# Altium footprint library iMag.PcbLib: 52 footprints (part 3 of 4)
Each footprint in its own frame and in the unit in brackets; x right, y up, seen from the top. Pads: shape width x height; smd on the part's side, far side on the other; paste and mask are expansions set on the pad; w line width, h text height; cw(c..) or ccw(c..) is an arc to the next point about the centre after c.
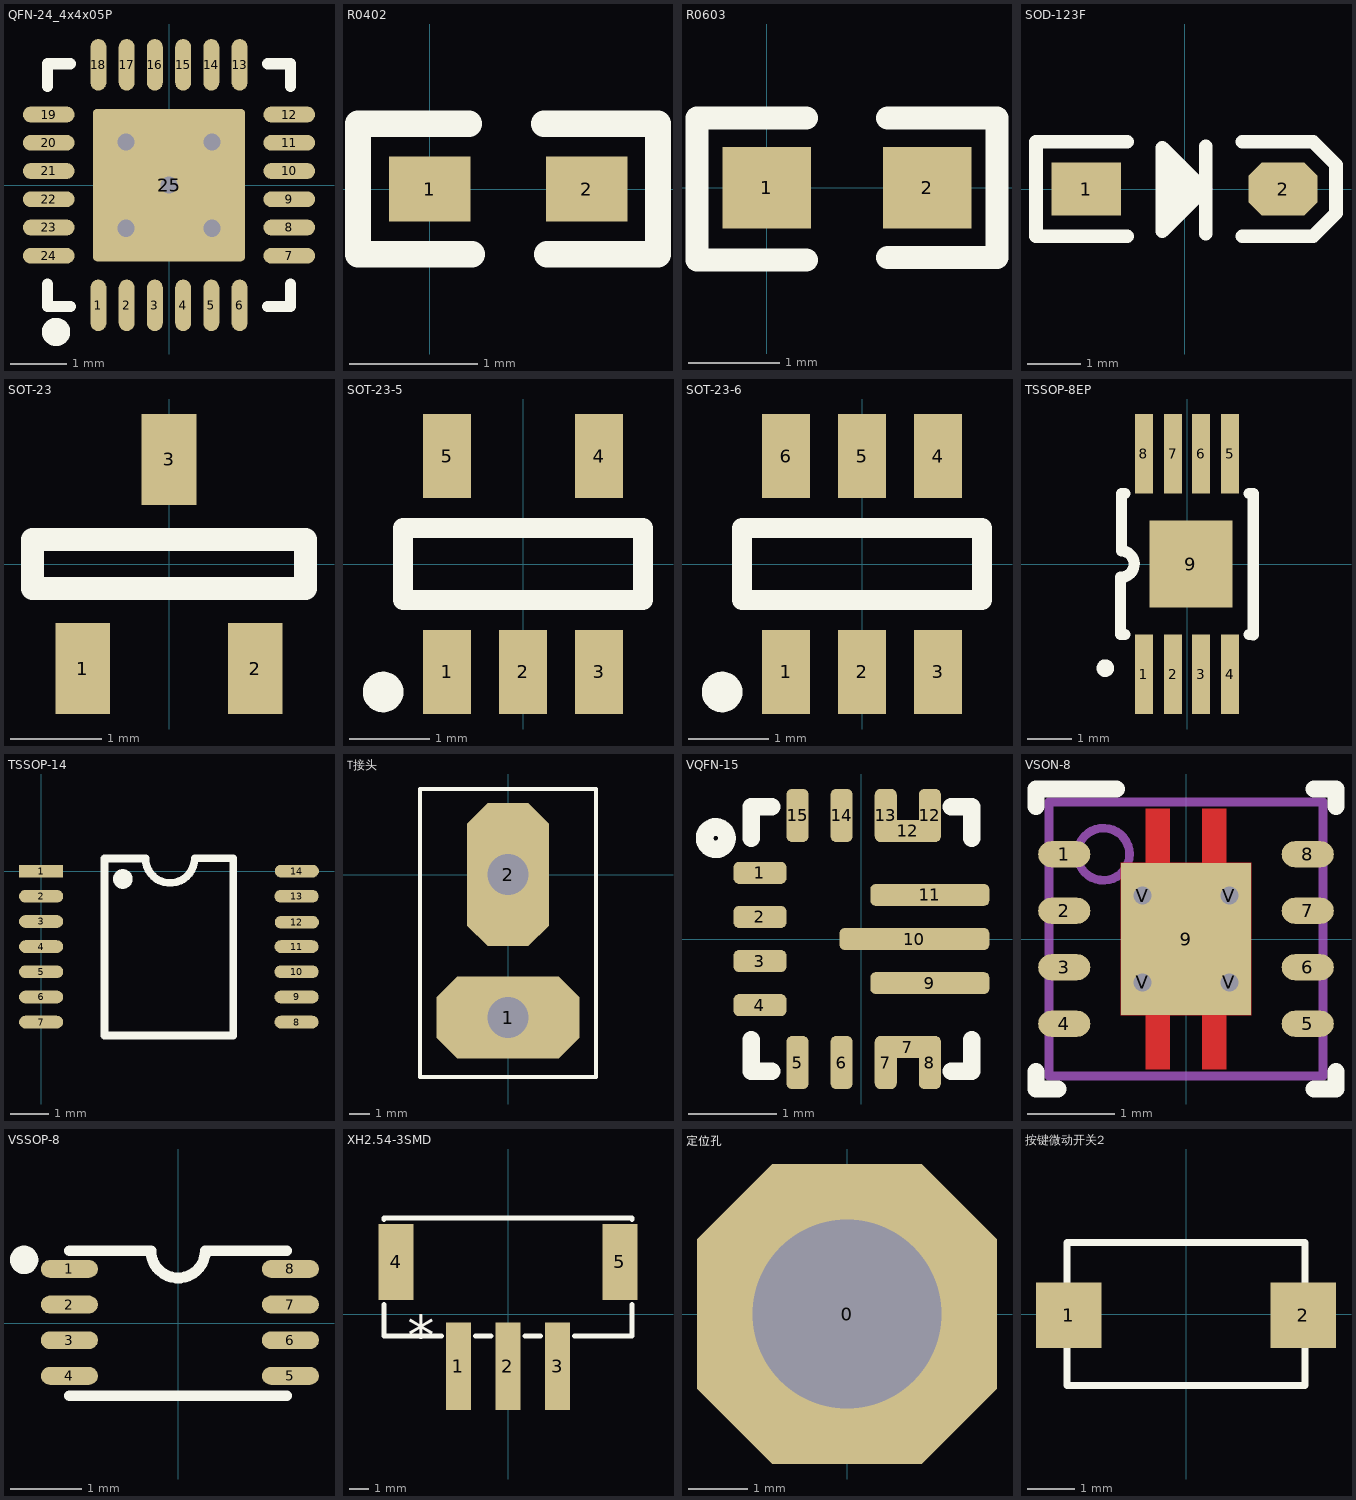
[diagram p2: the footprints below, top view; thin cyan lines are the x and y axes]

## QFN-24_4x4x05P [mm]
height 1
pads (25):
  oval 0.28x0.914 smd mask+0.051: 1(-1.25,-2.13) 2(-0.75,-2.13) 3(-0.25,-2.13) 4(0.25,-2.13) 5(0.75,-2.13) 6(1.25,-2.13) 13(1.25,2.13) 14(0.75,2.13) 15(0.25,2.13) 16(-0.25,2.13) 17(-0.75,2.13) 18(-1.25,2.13)
  oval 0.914x0.28 smd mask+0.051: 7(2.13,-1.25) 8(2.13,-0.75) 9(2.13,-0.25) 10(2.13,0.25) 11(2.13,0.75) 12(2.13,1.25) 19(-2.13,1.25) 20(-2.13,0.75) 21(-2.13,0.25) 22(-2.13,-0.25) 23(-2.13,-0.75) 24(-2.13,-1.25)
  rrect6% 2.7x2.7 smd mask+0.051: 25(0,0)
via -0.762,0.762 diameter 0.635 hole 0.305
via -0.762,-0.762 diameter 0.635 hole 0.305
via 0.762,-0.762 diameter 0.635 hole 0.305
via 0.762,0.762 diameter 0.635 hole 0.305
via 0,0 diameter 0.635 hole 0.305
Top Overlay:
  circle w0.25: c-2,-2.6 r0.125
  lines w0.2: -2.15,-1.75 -2.15,-2.15 -1.75,-2.15 ; -2.15,1.75 -2.15,2.15 -1.75,2.15 ; 1.75,-2.15 2.15,-2.15 2.15,-1.75 ; 1.75,2.15 2.15,2.15 2.15,1.75
3D body: height 0.9, standoff 0.01, extent -2,-2 2,2

## R0402 [mil] "1/16W"
pads (2):
  rect 25x20 smd: 1(0,0) 2(48.2,0)
Top Overlay:
  lines w8: 12,20 -22,20 -22,-20 13,-20 ; 35,20 70,20 70,-20 36,-20
3D body "R0402.STEP": height 13.78, standoff 0, extent 4.71,-9.79 44.09,9.9

## R0603 [mil] "1/10W"
pads (2):
  rect 38x35 smd: 1(0,0) 2(69,0)
Top Overlay:
  lines w10: 17,-31 -30,-31 -30,30 17,30 ; 52,-30 99,-30 99,30 52,30
3D body "R0603.STEP": height 17.72, standoff 0, extent 3.51,-15.74 66.5,15.75

## SOD-123F [mm] "2.7x1.6X1.1mm（长宽高，不包括引脚）"
pads (2):
  rect 1.3x1 smd: 1(-1.85,0)
  oct 1.3x1 smd: 2(1.85,0)
Top Overlay:
  lines w0.254: -1.079,-0.889 -2.794,-0.889 -2.794,0.889 -1.079,0.889 ; -0.254,0.559 -0.229,-0.432 0.254,0 0,0.254 0,0 0,-0.254 ; 0.356,-0.02 -0.417,-0.792 -0.417,0.775 0.396,-0.038 ; 0.396,-0.841 0.396,0.805 ; 1.079,-0.889 2.413,-0.889 2.845,-0.457 2.845,0.457 2.413,0.889 1.079,0.889
Mechanical 15:
  circle w0.05: c0,0 r0.35
  lines w0.05: -0.5,0 0.5,0 ; 0,-0.5 0,0.5
3D body "SOD-123F.STEP": height 1.15, standoff 0.04, extent -1.9,-0.8 1.9,0.8

## SOT-23 [mm] "SOT-23-3"
height 1.1
pads (3):
  rect 0.6x1 smd: 1(-0.95,-1.15) 2(0.95,-1.15) 3(0,1.15)
Top Overlay:
  lines w0.254: -1.5,-0.27 1.5,-0.27 1.5,0.27 -1.5,0.27 -1.5,-0.27
3D body "SOT-23-3.STEP": height 0.99, standoff 0.01, extent -1.46,-1.275 1.46,1.273

## SOT-23-5 [mm] "SOT-23-5"
height 1.2
pads (5):
  rect 0.6x1.05 smd: 1(-0.95,-1.35) 2(0,-1.35) 3(0.95,-1.35) 4(0.95,1.35) 5(-0.95,1.35)
Top Overlay:
  circle w0.254: c-1.75,-1.6 r0.127
  lines w0.254: -1.5,-0.45 -1.5,0.45 1.5,0.45 1.5,-0.45 -1.5,-0.45
3D body "SOT-23-5.STEP": height 1.3, standoff 0, extent -1.5,-1.5 1.5,1.5

## SOT-23-6 [mm] "SOT-23-6"
height 1.2
pads (6):
  rect 0.6x1.05 smd: 1(-0.95,-1.35) 2(0,-1.35) 3(0.95,-1.35) 4(0.95,1.35) 5(0,1.35) 6(-0.95,1.35)
Top Overlay:
  circle w0.254: c-1.75,-1.6 r0.127
  lines w0.254: -1.5,-0.45 -1.5,0.45 1.5,0.45 1.5,-0.45 -1.5,-0.45
3D body "SOT-23-6.STEP": height 1.3, standoff 0, extent -1.5,-1.5 1.5,1.5

## TSSOP-8EP [mil] "TSSOP-8_L3.0-W3.0-P0.65-LS4.9-BL-EP"
pads (9):
  rect 16x71 smd: 1(-38.5,-98.42) 2(-12.5,-98.42) 3(12.5,-98.42) 4(38.5,-98.42) 5(38.5,98.42) 6(12.5,98.42) 7(-12.5,98.42) 8(-38.5,98.42)
  rect 74.02x77.96 smd: 9(3.5,-0.03)
Top Overlay:
  circle w10: c-73,-93 r2.83
  lines w10: -55.6,-63 -59.5,-63 -59.5,-11.81 ccw(c-59,0.01) -58.5,11.81 -58.5,62.96 -55.6,62.96 ; 55.6,-63 59.1,-63 ; 55.6,62.96 59.1,62.96 ; 59.1,-63.1 59.1,62.8
3D body "PW8-M.step": height 47.09, standoff 0, extent -60.98,-129.99 60.99,130.01

## TSSOP-14 [mm] "4.96x4.40x1.00 e=0.65（蒜米工坊）"
pads (14):
  rect 1.143x0.33 smd: 1(0,0)
  oval 1.143x0.33 smd: 2(0,-0.65) 3(0,-1.3) 4(0,-1.95) 5(0,-2.6) 6(0,-3.25) 7(0,-3.9) 8(6.6,-3.9) 9(6.6,-3.25) 10(6.6,-2.6) 11(6.6,-1.95) 12(6.608,-1.321) 13(6.6,-0.65) 14(6.608,0)
Top Overlay:
  circle w0.254: c2.112,-0.203 r0.127
  lines w0.2: 2.687,0.325 1.635,0.325 1.635,-4.249 4.965,-4.249 4.965,0.325 ; 2.696,0.33 ccw(c3.331,0.33) 3.966,0.33 4.96,0.33
3D body "TSSOP14.STEP": height 1.03, standoff -0.02, extent 0.028,-4.43 6.432,0.57

## T接头 [mm]
pads (2):
  oct 7x4 hole 2 square: 1(0,-7)
  oct 4x7 hole 2 square: 2(0,0)
Top Overlay:
  lines w0.2: -4.318,-9.906 4.318,-9.906 4.318,-8.217 4.318,-2.233 4.318,4.191 -4.318,4.191 -4.318,-9.906

## VQFN-15 [mm]
pads (17):
  rrect50% 0.6x0.25 smd: 1(-1.15,0.75) 2(-1.15,0.25) 3(-1.15,-0.25) 4(-1.15,-0.75)
  rrect50% 0.25x0.6 smd: 5(-0.725,-1.4) 6(-0.225,-1.4) 7(0.275,-1.4) 8(0.775,-1.4) 12(0.775,1.4) 13(0.275,1.4) 14(-0.225,1.4) 15(-0.725,1.4)
  rrect50% 0.75x0.25 smd: 7(0.525,-1.225) 12(0.525,1.225)
  rrect50% 1.35x0.25 smd: 9(0.775,-0.5) 11(0.775,0.5)
  rrect50% 1.7x0.25 smd: 10(0.6,0)
Top Overlay:
  circle w0.2: c-1.651,1.143 r0.127
  lines w0.2: -1.25,-1.143 -1.25,-1.5 -1.016,-1.5 ; -1.25,1.143 -1.25,1.5 -1.016,1.5 ; 1.016,-1.5 1.25,-1.5 1.25,-1.143 ; 1.016,1.5 1.25,1.5 1.25,1.143
3D body "RNM0015A.stp": height 1, standoff 0, extent -1.25,-1.5 1.25,1.5

## VSON-8 [mm]
pads (13):
  oval 0.6x0.3 smd paste-0.102 mask+0.051: 1(-1.4,0.975) 2(-1.4,0.325) 3(-1.4,-0.325) 4(-1.4,-0.975) 5(1.4,-0.975) 6(1.4,-0.325) 7(1.4,0.325) 8(1.4,0.975)
  rect 1.5x1.75 smd paste-0.862 mask+0.051: 9(0,0)
  round 0.5 hole 0.203 mask+0.051: V(-0.5,-0.5) V(-0.5,0.5) V(0.5,-0.5) V(0.5,0.5)
Top Layer:
  region: -0.185,-1.5 -0.465,-1.5 -0.465,-0.875 -0.75,-0.875 -0.75,0.875 -0.465,0.875 -0.465,1.5 -0.185,1.5 -0.185,0.875 0.185,0.875 0.185,1.5 0.465,1.5 0.465,0.875 0.75,0.875 0.75,-0.875 0.465,-0.875 0.465,-1.5 0.185,-1.5 0.185,-0.875 -0.185,-0.875
Top Overlay:
  lines w0.2: -1.725,-1.525 -1.725,-1.725 -1.475,-1.725 ; -1.725,1.525 -1.725,1.725 -0.8,1.725 ; 1.475,-1.725 1.725,-1.725 1.725,-1.525 ; 1.475,1.725 1.725,1.725 1.725,1.525
Top Paste:
  region: -0.691,0.793 -0.691,-0.793 0.692,-0.793 0.692,0.793
Mechanical 13:
  circle w0.1: c-0.95,0.975 r0.3
  lines w0.1: -1.575,-1.575 1.575,-1.575 1.575,1.575 -1.575,1.575 -1.575,-1.575
3D body "DRB0008A.stp": height 0.77, standoff 0, extent -1.5,-1.5 1.5,1.5

## VSSOP-8 [mm]
pads (8):
  oval 0.8x0.25 smd mask+0.05: 1(-1.524,0.762) 2(-1.524,0.262) 3(-1.524,-0.238) 4(-1.524,-0.738) 5(1.576,-0.738) 6(1.576,-0.238) 7(1.576,0.262) 8(1.576,0.762)
Top Overlay:
  circle w0.254: c-2.159,0.889 r0.072
  lines w0.152: -1.524,-1.016 1.524,-1.016 ; -1.524,1.016 -0.381,1.016 ccw(c0,1.016) 0.381,1.016 1.524,1.016
3D body "DCU0008A.stp": height 0.77, standoff 0, extent -1.55,-1 1.55,1

## XH2.54-3SMD [mm] "CONN-SMD_3P-P2.54_XH2.54-3AB"
pads (5):
  rect 1.3x4.5 smd: 1(-2.54,-2.675) 2(0,-2.675) 3(2.54,-2.675)
  rect 1.801x3.901 smd: 4(-5.741,2.675) 5(5.741,2.675)
Top Overlay:
  lines w0.254: -6.349,0.493 -6.349,-1.135 -3.421,-1.135 ; -6.349,4.857 -6.349,4.925 6.35,4.925 6.35,4.857 ; -1.659,-1.135 -0.881,-1.135 ; 0.881,-1.135 1.659,-1.135 ; 3.421,-1.135 6.35,-1.135 6.35,0.493
  text "*" at -3.759,0.77 h2.03
3D body "User Library-CWF-3.step": height 5.85, standoff 0.15, extent -5.047,-4.869 4.953,5.631

## 定位孔 [mm]
pads (1):
  oct 5.08x5.08 hole 3.2: 0(0,0)

## 按键微动开关2 [mm]
pads (2):
  rect 1.4x1.4 smd: 1(-2.5,-0.024) 2(2.5,-0.024)
Top Overlay:
  lines w0.15: -2.54,-1.524 2.54,-1.524 2.54,1.524 -2.54,1.524 -2.54,-1.524
3D body "SW-PB 3X4.STEP": height 2.1, standoff -0.05, extent -2.5,-1.524 2.5,1.476